# Altium footprint library My Library.PcbLib: 872 footprints (part 42 of 55)
Each footprint in its own frame and in the unit in brackets; x right, y up, seen from the top. Pads: shape width x height; smd on the part's side, far side on the other; paste and mask are expansions set on the pad; w line width, h text height; cw(c..) or ccw(c..) is an arc to the next point about the centre after c.
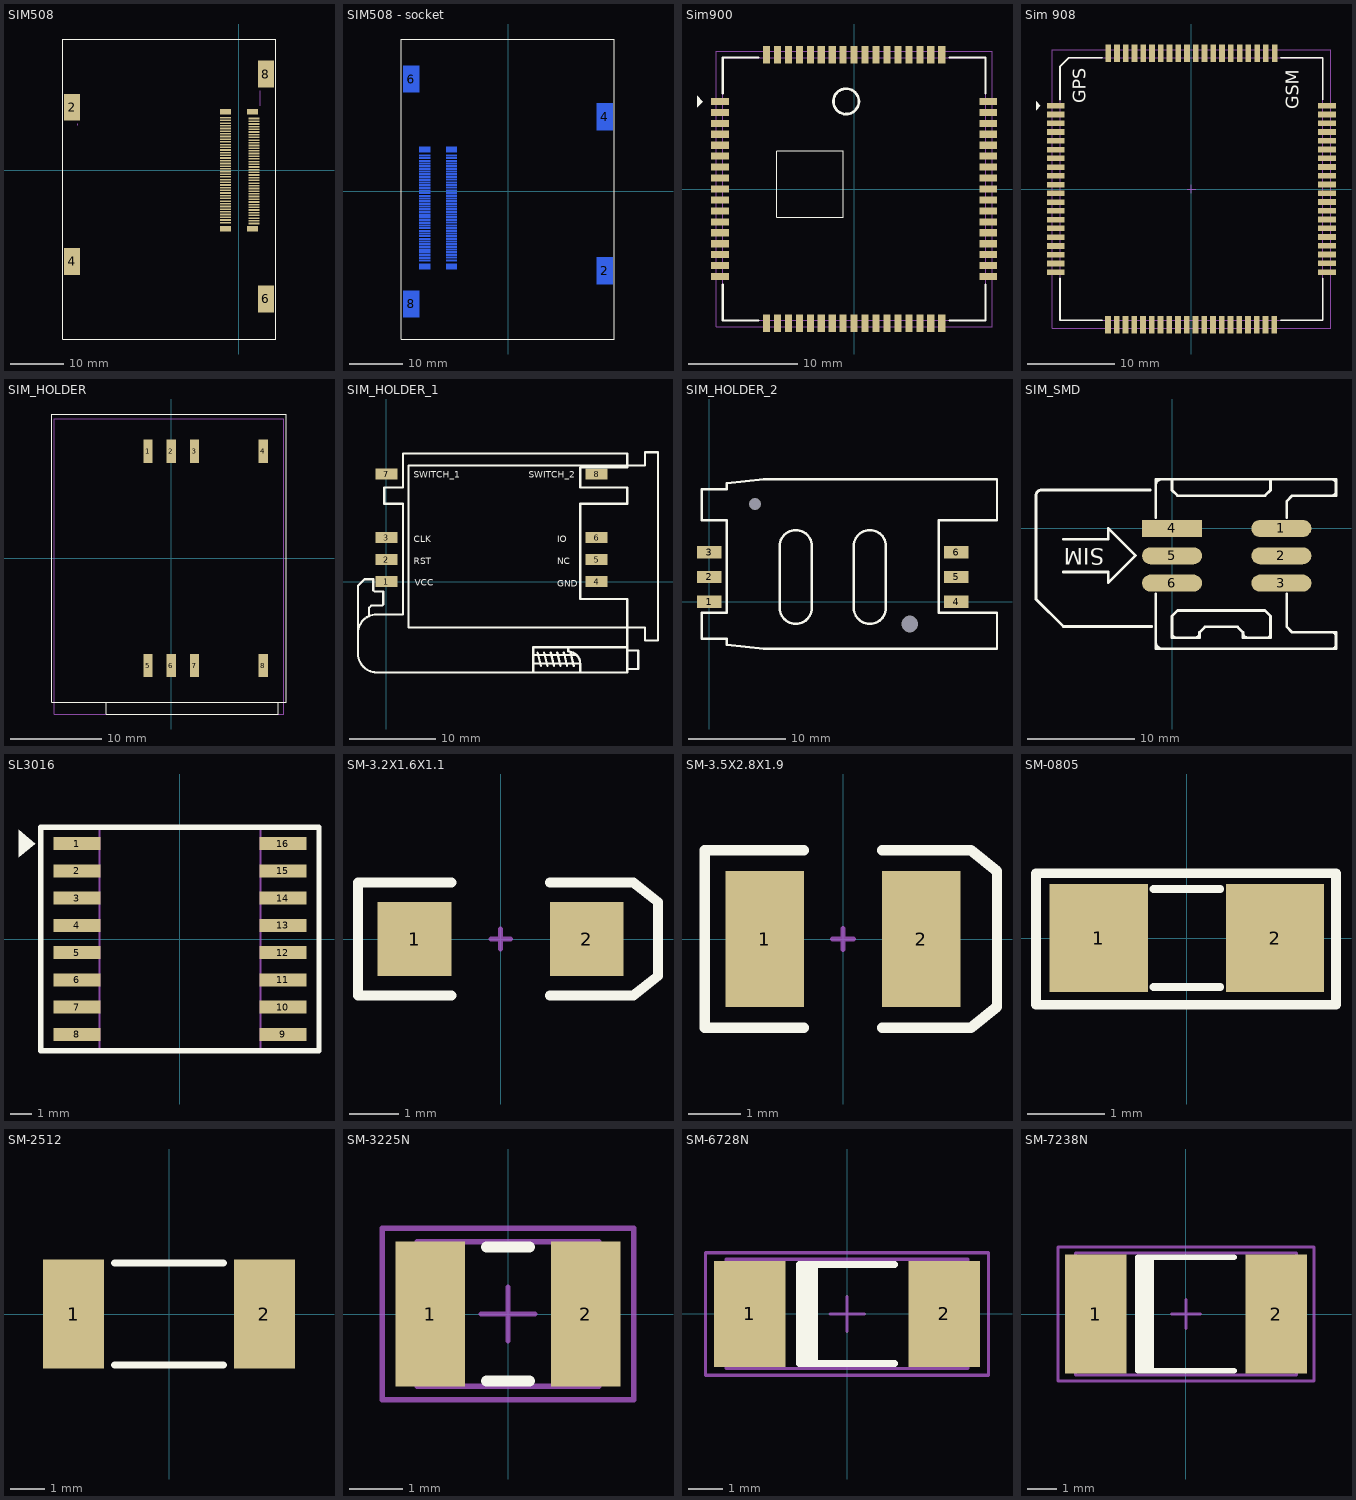
[diagram p41: the footprints below, top view; thin cyan lines are the x and y axes]

## SIM508 [mm]
pads (88):
  rect 2x0.305 smd: 1(-2.499,-9.75) 2(2.794,-9.906) 3(-2.499,-9.25) 4(2.794,-9.406) 5(-2.499,-8.75) 6(2.794,-8.906) 7(-2.499,-8.25) 8(2.794,-8.406) 9(-2.499,-7.75) 10(2.794,-7.906) 11(-2.499,-7.25) 12(2.794,-7.406) 13(-2.499,-6.75) 14(2.794,-6.906) 15(-2.499,-6.25) 16(2.794,-6.406) 17(-2.499,-5.75) 18(2.794,-5.906) 19(-2.499,-5.25) 20(2.794,-5.406) 21(-2.499,-4.75) 22(2.794,-4.906) 23(-2.499,-4.25) 24(2.794,-4.406) 25(-2.499,-3.75) 26(2.794,-3.906) 27(-2.499,-3.25) 28(2.794,-3.406) 29(-2.499,-2.75) 30(2.794,-2.906) 31(-2.499,-2.25) 32(2.794,-2.406) 33(-2.499,-1.75) 34(2.794,-1.906) 35(-2.499,-1.25) 36(2.794,-1.406) 37(-2.499,-0.75) 38(2.794,-0.906) 39(-2.499,-0.25) 40(2.794,-0.406) 41(-2.499,0.25) 42(2.794,0.094) 43(-2.499,0.75) 44(2.794,0.594) 45(-2.499,1.25) 46(2.794,1.094) 47(-2.499,1.75) 48(2.794,1.594) 49(-2.499,2.25) 50(2.794,2.094) 51(-2.499,2.75) 52(2.794,2.594) 53(-2.499,3.25) 54(2.794,3.094) 55(-2.499,3.75) 56(2.794,3.594) 57(-2.499,4.25) 58(2.794,4.094) 59(-2.499,4.75) 60(2.794,4.594) 61(-2.499,5.25) 62(2.794,5.094) 63(-2.499,5.75) 64(2.794,5.594) 65(-2.499,6.25) 66(2.794,6.094) 67(-2.499,6.75) 68(2.794,6.594) 69(-2.499,7.25) 70(2.794,7.094) 71(-2.499,7.75) 72(2.794,7.594) 73(-2.499,8.25) 74(2.794,8.094) 75(-2.499,8.75) 76(2.794,8.594) 77(-2.499,9.25) 78(2.794,9.094) 79(-2.499,9.75) 80(2.794,9.594)
  rect 3x5 smd: 2(-31,11.691) 4(-31,-16.945) 6(5,-23.945) 8(5,17.871)
  rect 2x1 smd: ""(-2.499,-10.875) ""(-2.499,10.875) ""(2.499,-10.875) ""(2.499,10.875)
Top Overlay:
  lines w0.102: -32.766,-31.383 6.858,-31.383 6.858,24.383 -32.766,24.383 -32.766,-31.383
Mechanical 1:
  lines w0.102: -30,8.357 -30,8.636 ; 4,11.938 4,14.732
3D body: height 0.2, standoff 0, extent -2.441,-5.855 -1.501,-5.642
3D body: height 2, standoff 0, extent -1.626,-11.481 1.6,11.405
3D body: height 0.2, standoff 0, extent 1.499,10.516 2.438,11.227
3D body: height 0.2, standoff 0, extent 1.499,-11.234 2.438,-10.523
3D body: height 0.2, standoff 0, extent -2.441,-11.227 -1.501,-10.516
3D body: height 0.2, standoff 0, extent -2.441,10.523 -1.501,11.234
3D body: height 0.2, standoff 0, extent 1.498,9.642 2.438,9.855
3D body: height 0.2, standoff 0, extent 1.498,9.142 2.438,9.355
3D body: height 0.2, standoff 0, extent 1.498,8.142 2.438,8.355
3D body: height 0.2, standoff 0, extent 1.498,8.642 2.438,8.855
3D body: height 0.2, standoff 0, extent 1.498,6.642 2.438,6.855
3D body: height 0.2, standoff 0, extent 1.498,6.142 2.438,6.355
3D body: height 0.2, standoff 0, extent 1.498,7.142 2.438,7.355
3D body: height 0.2, standoff 0, extent 1.498,7.642 2.438,7.855
3D body: height 0.2, standoff 0, extent 1.498,3.642 2.438,3.855
3D body: height 0.2, standoff 0, extent 1.498,3.142 2.438,3.355
3D body: height 0.2, standoff 0, extent 1.498,2.142 2.438,2.355
3D body: height 0.2, standoff 0, extent 1.498,2.642 2.438,2.855
3D body: height 0.2, standoff 0, extent 1.498,4.642 2.438,4.855
3D body: height 0.2, standoff 0, extent 1.498,4.142 2.438,4.355
3D body: height 0.2, standoff 0, extent 1.498,5.142 2.438,5.355
3D body: height 0.2, standoff 0, extent 1.498,5.642 2.438,5.855
3D body: height 0.2, standoff 0, extent 1.498,-2.358 2.438,-2.145
3D body: height 0.2, standoff 0, extent 1.498,-2.858 2.438,-2.645
3D body: height 0.2, standoff 0, extent 1.498,-3.858 2.438,-3.645
3D body: height 0.2, standoff 0, extent 1.498,-3.358 2.438,-3.145
3D body: height 0.2, standoff 0, extent 1.498,-5.358 2.438,-5.145
3D body: height 0.2, standoff 0, extent 1.498,-5.858 2.438,-5.645
3D body: height 0.2, standoff 0, extent 1.498,-4.858 2.438,-4.645
3D body: height 0.2, standoff 0, extent 1.498,-4.358 2.438,-4.145
3D body: height 0.2, standoff 0, extent 1.498,-0.358 2.438,-0.145
3D body: height 0.2, standoff 0, extent 1.498,-0.858 2.438,-0.645
3D body: height 0.2, standoff 0, extent 1.498,-1.858 2.438,-1.645
3D body: height 0.2, standoff 0, extent 1.498,-1.358 2.438,-1.145
3D body: height 0.2, standoff 0, extent 1.498,0.642 2.438,0.855
3D body: height 0.2, standoff 0, extent 1.498,0.142 2.438,0.355
3D body: height 0.2, standoff 0, extent 1.498,1.142 2.438,1.355
3D body: height 0.2, standoff 0, extent 1.498,1.642 2.438,1.855
3D body: height 0.2, standoff 0, extent 1.498,-8.358 2.438,-8.145
3D body: height 0.2, standoff 0, extent 1.498,-8.858 2.438,-8.645
3D body: height 0.2, standoff 0, extent 1.498,-9.858 2.438,-9.645
3D body: height 0.2, standoff 0, extent 1.498,-9.358 2.438,-9.145
3D body: height 0.2, standoff 0, extent 1.498,-7.358 2.438,-7.145
3D body: height 0.2, standoff 0, extent 1.498,-7.858 2.438,-7.645
3D body: height 0.2, standoff 0, extent 1.498,-6.858 2.438,-6.645
3D body: height 0.2, standoff 0, extent 1.498,-6.358 2.438,-6.145
3D body: height 0.2, standoff 0, extent -2.441,6.145 -1.501,6.358
3D body: height 0.2, standoff 0, extent -2.441,6.645 -1.501,6.858
3D body: height 0.2, standoff 0, extent -2.441,7.645 -1.501,7.858
3D body: height 0.2, standoff 0, extent -2.441,7.145 -1.501,7.358
3D body: height 0.2, standoff 0, extent -2.441,9.145 -1.501,9.358
3D body: height 0.2, standoff 0, extent -2.441,9.645 -1.501,9.858
3D body: height 0.2, standoff 0, extent -2.441,8.645 -1.501,8.858
3D body: height 0.2, standoff 0, extent -2.441,8.145 -1.501,8.358
3D body: height 0.2, standoff 0, extent -2.441,-1.855 -1.501,-1.642
3D body: height 0.2, standoff 0, extent -2.441,-1.355 -1.501,-1.142
3D body: height 0.2, standoff 0, extent -2.441,-0.355 -1.501,-0.142
3D body: height 0.2, standoff 0, extent -2.441,-0.855 -1.501,-0.642
3D body: height 0.2, standoff 0, extent -2.441,1.145 -1.501,1.358
3D body: height 0.2, standoff 0, extent -2.441,1.645 -1.501,1.858
3D body: height 0.2, standoff 0, extent -2.441,0.645 -1.501,0.858
3D body: height 0.2, standoff 0, extent -2.441,0.145 -1.501,0.358
3D body: height 0.2, standoff 0, extent -2.441,4.145 -1.501,4.358
3D body: height 0.2, standoff 0, extent -2.441,4.645 -1.501,4.858
3D body: height 0.2, standoff 0, extent -2.441,5.645 -1.501,5.858
3D body: height 0.2, standoff 0, extent -2.441,5.145 -1.501,5.358
3D body: height 0.2, standoff 0, extent -2.441,3.145 -1.501,3.358
3D body: height 0.2, standoff 0, extent -2.441,3.645 -1.501,3.858
3D body: height 0.2, standoff 0, extent -2.441,2.645 -1.501,2.858
3D body: height 0.2, standoff 0, extent -2.441,2.145 -1.501,2.358
3D body: height 0.2, standoff 0, extent -2.441,-5.355 -1.501,-5.142
3D body: height 0.2, standoff 0, extent -2.441,-4.355 -1.501,-4.142
3D body: height 0.2, standoff 0, extent -2.441,-4.855 -1.501,-4.642
3D body: height 0.2, standoff 0, extent -2.441,-2.855 -1.501,-2.642
3D body: height 0.2, standoff 0, extent -2.441,-2.355 -1.501,-2.142
3D body: height 0.2, standoff 0, extent -2.441,-3.355 -1.501,-3.142
3D body: height 0.2, standoff 0, extent -2.441,-3.855 -1.501,-3.642
3D body: height 0.2, standoff 0, extent -2.441,-7.855 -1.501,-7.642
3D body: height 0.2, standoff 0, extent -2.441,-7.355 -1.501,-7.142
3D body: height 0.2, standoff 0, extent -2.441,-6.355 -1.501,-6.142
3D body: height 0.2, standoff 0, extent -2.441,-6.855 -1.501,-6.642
3D body: height 0.2, standoff 0, extent -2.441,-8.855 -1.501,-8.642
3D body: height 0.2, standoff 0, extent -2.441,-8.355 -1.501,-8.142
3D body: height 0.2, standoff 0, extent -2.441,-9.355 -1.501,-9.142
3D body: height 0.2, standoff 0, extent -2.441,-9.855 -1.501,-9.642
3D body: height 0.2, standoff 0, extent 3.73,16.384 5.75,19.384
3D body: height 0.2, standoff 0, extent 3.73,-25.432 5.75,-22.432
3D body: height 0.2, standoff 0, extent -31.75,-18.458 -29.73,-15.458
3D body: height 0.2, standoff 0, extent -31.75,10.178 -29.73,13.178
3D body: height 2, standoff 0, extent -29.718,-30.607 3.759,23.622
3D body: height 3, standoff 2, extent -30,-30.875 4,23.875

## SIM508 - socket [mil]
pads (88):
  rect 78.74x12 smd far side: 1(-610.18,264) 2(-413.44,264) 3(-610.18,244) 4(-413.44,244) 5(-610.18,224) 6(-413.44,224) 7(-610.18,205) 8(-413.44,205) 9(-610.18,185) 10(-413.44,185) 11(-610.18,165) 12(-413.44,165) 13(-610.18,146) 14(-413.44,146) 15(-610.18,126) 16(-413.44,126) 17(-610.18,106) 18(-413.44,106) 19(-610.18,86) 20(-413.44,87) 21(-610.18,67) 22(-413.44,67) 23(-610.18,47) 24(-413.44,47) 25(-610.18,27) 26(-413.44,28) 27(-610.18,8) 28(-413.44,8) 29(-610.18,-12) 30(-413.44,-12) 31(-610.18,-32) 32(-413.44,-31) 33(-610.18,-51) 34(-413.44,-51) 35(-610.18,-71) 36(-413.44,-71) 37(-610.18,-91) 38(-413.44,-91) 39(-610.18,-111) 40(-413.44,-110) 41(-610.18,-130) 42(-413.44,-130) 43(-610.18,-150) 44(-413.44,-150) 45(-610.18,-170) 46(-413.44,-169) 47(-610.18,-189) 48(-413.44,-189) 49(-610.18,-209) 50(-413.44,-209) 51(-610.18,-229) 52(-413.44,-228) 53(-610.18,-248) 54(-413.44,-248) 55(-610.18,-268) 56(-413.44,-268) 57(-610.18,-288) 58(-413.44,-287) 59(-610.18,-308) 60(-413.44,-307) 61(-610.18,-327) 62(-413.44,-327) 63(-610.18,-347) 64(-413.44,-346) 65(-610.18,-367) 66(-413.44,-366) 67(-610.18,-386) 68(-413.44,-386) 69(-610.18,-406) 70(-413.44,-406) 71(-610.18,-426) 72(-413.44,-425) 73(-610.18,-445) 74(-413.44,-445) 75(-610.18,-465) 76(-413.44,-465) 77(-610.18,-485) 78(-413.44,-484) 79(-610.18,-504) 80(-413.44,-504)
  rect 118.11x196.85 smd far side: 2(708.66,-579.84) 4(708.66,547.56) 6(-708.66,823.15) 8(-708.66,-823.15)
  rect 78.74x39.37 smd far side: ""(-610.18,-547.72) ""(-610.18,308.58) ""(-413.44,-547.72) ""(-413.44,308.58)
Top Overlay:
  lines w4: -781.81,-1079.53 -781.81,1115.98 778.19,1115.98 778.19,-1079.53 -781.81,-1079.53
3D body: height -19.68, standoff -59.06, extent -574.81,-568.57 -447.81,332.43
3D body: height 7.87, standoff 0, extent -738.19,-882.71 -658.67,-764.6
3D body: height 7.87, standoff 0, extent -738.19,763.58 -658.67,881.69
3D body: height 7.87, standoff 0, extent 658.67,489.01 738.19,607.12
3D body: height 7.87, standoff 0, extent 658.67,-638.38 738.19,-520.27

## Sim900 [mm] "Sim900,QFN, 68-Leads, Body 24,0x24,0mm (max), Pitch 1,00mm, IPC Medium Density"
height 3
pads (68):
  rect 1.6x0.65 smd: 1(-12.25,8) 2(-12.25,7) 3(-12.25,6) 4(-12.25,5) 5(-12.25,4) 6(-12.25,3) 7(-12.25,2) 8(-12.25,1) 9(-12.25,0) 10(-12.25,-1) 11(-12.25,-2) 12(-12.25,-3) 13(-12.25,-4) 14(-12.25,-5) 15(-12.25,-6) 16(-12.25,-7) 17(-12.25,-8) 35(12.25,-8) 36(12.25,-7) 37(12.25,-6) 38(12.25,-5) 39(12.25,-4) 40(12.25,-3) 41(12.25,-2) 42(12.25,-1) 43(12.25,0) 44(12.25,1) 45(12.25,2) 46(12.25,3) 47(12.25,4) 48(12.25,5) 49(12.25,6) 50(12.25,7) 51(12.25,8)
  rect 0.65x1.6 smd: 18(-8,-12.25) 19(-7,-12.25) 20(-6,-12.25) 21(-5,-12.25) 22(-4,-12.25) 23(-3,-12.25) 24(-2,-12.25) 25(-1,-12.25) 26(0,-12.25) 27(1,-12.25) 28(2,-12.25) 29(3,-12.25) 30(4,-12.25) 31(5,-12.25) 32(6,-12.25) 33(7,-12.25) 34(8,-12.25) 52(8,12.25) 53(7,12.25) 54(6,12.25) 55(5,12.25) 56(4,12.25) 57(3,12.25) 58(2,12.25) 59(1,12.25) 60(0,12.25) 61(-1,12.25) 62(-2,12.25) 63(-3,12.25) 64(-4,12.25) 65(-5,12.25) 66(-6,12.25) 67(-7,12.25) 68(-8,12.25)
Top Overlay:
  circle w0.254: c-0.727,8 r1.163
  region: -14.351,8.499 -13.843,7.991 -14.351,7.483
  lines w0.1: -7.087,-2.6 -7.087,3.429 ; -7.077,-2.6 -1,-2.6 -1,3.477 -7.077,3.477
  lines w0.2: -12,-8.725 -12,-12 -8.725,-12 ; -12,8.725 -12,12 -8.725,12 ; 8.725,-12 12,-12 12,-8.725 ; 8.725,12 12,12 12,8.725
Mechanical 13:
  lines w0.1: -12,-12 -12,12 12,12 12,-12 -12,-12
Mechanical 15:
  lines w0.1: -12.6,-12.6 -12.6,12.6 12.6,12.6 12.6,-12.6 -12.6,-12.6
3D body "User Library-GSM_SIM900.STEP": height 3, standoff 0, extent -12,-11.949 12,12.051

## Sim 908 [mil] "Sim 908 GPRS-GPS"
pads (80):
  rect 80x25.59 smd: 1(-610,374.02) 2(-610,334.65) 3(-610,295.28) 4(-610,255.91) 5(-610,216.54) 6(-610,177.17) 7(-610,137.8) 8(-610,98.43) 9(-610,59.06) 10(-610,19.69) 11(-610,-19.68) 12(-610,-59.06) 13(-610,-98.43) 14(-610,-137.8) 15(-610,-177.17) 16(-610,-216.54) 17(-610,-255.91) 18(-610,-295.28) 19(-610,-334.65) 20(-610,-374.02) 41(610,-373.66) 42(610,-334.29) 43(610,-294.92) 44(610,-255.55) 45(610,-216.18) 46(610,-176.81) 47(610,-137.44) 48(610,-98.07) 49(610,-58.7) 50(610,-19.33) 51(610,20.04) 52(610,59.41) 53(610,98.78) 54(610,138.15) 55(610,177.52) 56(610,216.89) 57(610,256.26) 58(610,295.63) 59(610,335) 60(610,374.37)
  rect 25.59x80 smd: 21(-375.59,-610) 22(-336.22,-610) 23(-296.85,-610) 24(-257.48,-610) 25(-218.11,-610) 26(-178.74,-610) 27(-139.37,-610) 28(-100,-610) 29(-60.63,-610) 30(-21.26,-610) 31(18.11,-610) 32(57.48,-610) 33(96.85,-610) 34(136.22,-610) 35(175.59,-610) 36(214.96,-610) 37(254.33,-610) 38(293.7,-610) 39(333.07,-610) 40(372.44,-610) 61(374.02,610) 62(334.65,610) 63(295.28,610) 64(255.91,610) 65(216.54,610) 66(177.17,610) 67(137.8,610) 68(98.43,610) 69(59.06,610) 70(19.68,610) 71(-19.69,610) 72(-59.06,610) 73(-98.43,610) 74(-137.8,610) 75(-177.17,610) 76(-216.54,610) 77(-255.91,610) 78(-295.28,610) 79(-334.65,610) 80(-374.02,610)
Top Overlay:
  region: -699,394 -679,374 -699,354
  lines w7.87: -590.55,-402.56 -590.55,-590.55 -402.56,-590.55 ; -590.55,402.56 -590.55,551.18 -551.18,590.55 -402.56,590.55 ; 402.56,-590.55 590.55,-590.55 590.55,-402.56 ; 402.56,590.55 590.55,590.55 590.55,402.56
  text "GPS" at -454,386 h98.43
  text "GSM" at 503,358 h98.43
Mechanical 13:
  lines w3.94: -590.55,-590.55 590.55,-590.55 590.55,590.55 -551.18,590.55 -590.55,551.18 -590.55,-590.55
Mechanical 15:
  lines w3.94: -19.69,0 19.68,0 ; 0,-19.68 0,19.69 ; -626.97,-626.97 626.97,-626.97 626.97,626.97 -626.97,626.97 -626.97,-626.97
3D body "User Library-SIM908.STEP": height 126.59, standoff 0.6, extent -590.3,-592.22 590.81,588.89

## SIM_HOLDER [mm]
pads (8):
  rect 1x2.54 smd: 1(-2.542,11.72) 2(-0.002,11.72) 3(2.538,11.72) 4(10.058,11.72) 5(-2.542,-11.72) 6(-0.002,-11.72) 7(2.538,-11.72) 8(10.058,-11.72)
Top Overlay:
  lines w0.1: -7.112,-15.748 -7.112,-17.018 11.684,-17.018 11.684,-15.748
  lines w0.102: -13.066,-15.748 12.558,-15.748 12.558,15.782 -13.066,15.782 -13.066,-15.748
Mechanical 1:
  lines w0.102: -12.812,-17.018 -8.114,-17.018 11.886,-17.018 12.304,-17.018 12.304,-15.45 12.304,0 12.304,10.45 12.304,15.274 -8.198,15.274 -12.812,15.274 -12.812,-4.65 -12.812,-15.45 -12.812,-17.018
3D body: height 1.7, standoff 1.2, extent -7.111,11.211 -2.83,15.274
3D body: height 3.5, standoff 0, extent -8.114,-17.018 11.886,-16.45
3D body: height 3, standoff 0, extent -7.312,-16.45 11.104,10.45
3D body: height 3, standoff 0, extent 11.104,-15.45 12.304,10.45
3D body: height 3, standoff 0, extent -12.812,-15.449 -5.812,15.274
3D body: height 2.4, standoff 0.6, extent -12.243,-16.509 -10.451,-15.409
3D body: height 3, standoff 0, extent 5.283,10.451 7.821,12.953
3D body: height 3, standoff 0, extent -12.811,-15.449 -9.813,-4.651

## SIM_HOLDER_1 [mil]
pads (8):
  rect 100x50 smd: 1(0,0) 2(0,100) 3(0,200) 4(960,0) 5(960,100) 6(960,200) 7(0,490) 8(960,490)
Top Overlay:
  lines w10: -130,-225 -130,-20 -100,10 -60,10 -60,-40 -55,-45 -15,-45 -15,-105 -20,-110 -70,-110 -80,-120 -80,-160 ; -45,-414.85 cw(c-45,-330) -129.85,-330 -130,-330 -130,-235 cw(c-45.15,-235) -45.15,-150.15 74.85,-150.15 75,-150 75,355 -10,355 -10,430 75,430 75,585 1100,585 1100,520 885,520 885,430 1100,430 1100,355 885,355 885,-80 1100,-80 1100,-415 ; -44.85,-415 1100,-415 ; 670,-414.85 670,-300 1100,-300 ; 670,-375 885,-375 ; 670,-335 865,-335 ; 690,-325 705,-385 ; 720,-325 735,-385 ; 750,-325 765,-385 ; 780,-325 795,-385 ; 810,-325 825,-385 ; 830,-300 830,-320 cw(c830,-375) 885,-375 ; 840,-325 855,-385 ; 885,-414.85 885,-375 ; 1100,-414.85 1100,-415 ; 1100,-400 1150,-400 1150,-315 1100,-315 ; 100,-210 100,530 1180,530 1180,590 1240,590 1240,-270 1200,-270 1180,-270 1180,-210 100,-210
  text "SWITCH_2" at 650,475 h30
  text "SWITCH_1" at 125,475 h30
  text "GND" at 780,-25 h30
  text "NC" at 780,80 h30
  text "IO" at 780,180 h30
  text "CLK" at 125,180 h30
  text "VCC" at 130,-20 h30
  text "RST" at 125,80 h30
Mechanical 3:
  text "SW" at 836,480 h20
  text "SW" at 90,480 h20
  text "CLK" at 90,190 h20
  text "I/0" at 820,190 h20
  text "VPP" at 817,90 h20
  text "GND" at 817,-10 h20
  text "VCC" at 90,-10 h20
  text "RST" at 90,90 h20

## SIM_HOLDER_2 [mil]
pads (8):
  rect 100x50 smd: 1(0,0) 2(0,100) 3(0,200) 4(1000,0) 5(1000,100) 6(1000,200)
  round 10 hole 68: 3(812,-90)
  round 10 hole 48: 4(185,395)
Top Overlay:
  lines w10: -30,-150 -30,-45 70,-45 70,330 -30,330 -30,455 70,455 70,480 220,495 1165,495 1165,330 930,330 930,-45 1165,-45 1165,-190 220,-190 70,-175 70,-150 -30,-150 ; 285,-25 ccw(c350,-25) 415,-25 415,225 ccw(c350,225) 285,225 285,-25 ; 585,-25 ccw(c650,-25) 715,-25 715,225 ccw(c650,225) 585,225 585,-25
Mechanical 3:
  text "CLK" at 85,190 h20
  text "RST" at 85,90 h20
  text "VCC" at 85,-10 h20
  text "GND" at 862,-10 h20
  text "VPP" at 862,90 h20
  text "I/0" at 865,190 h20

## SIM_SMD [mil]
pads (6):
  oval 220x62 smd: 1(400,0) 2(400,-100) 3(400,-200) 5(0,-100) 6(0,-200)
  rect 220x62 smd: 4(0,0)
Top Overlay:
  lines w10: -398,-159 -234,-159 -234,-199 -134,-99 -234,1 -234,-39 -397,-39 ; -80,141 -478,141 ccw(c-478,121) -498,121 -498,-259 -398,-359 -74,-359 ; -60,-413 -60,-417 ccw(c-37,-417) -37,-440 ; -60,-400 -60,-240 ; -60,-300 -60,-440 600,-440 600,-380 440,-380 420,-360 420,-300 420,-240 ; -60,40 -60,180 600,180 600,120 440,120 420,100 420,40 ; -60,140 -60,159 cw(c-39,159) -39,180 ; 0,-383 0,-386 ccw(c14,-386) 14,-400 ; 0,180 0,140 20,120 120,120 340,120 360,140 360,180 ; 86,-400 ccw(c86,-386) 100,-386 100,-380 ; 276,-400 cw(c276,-384) 260,-384 260,-380 ; 343,-400 349,-400 ccw(c349,-389) 360,-389 ; 581,-440 583,-440 ; 585,120 ccw(c585,135) 600,135 600,137 ; 585,180 cw(c585,165) 600,165 600,162 ; 587,-440 ccw(c587,-427) 600,-427 600,-425 ; 587,-380 cw(c587,-393) 600,-393 600,-394 ; 100,-380 100,-400 0,-400 0,-320 20,-300 340,-300 360,-320 360,-380 360,-400 260,-400 260,-380 ; 100,-380 120,-360 240,-360 260,-380
  text "SIM" at -248,-73 h60

## SL3016 [mm]
pads (16):
  rect 2.2x0.6 smd: 1(-4.795,4.445) 2(-4.795,3.175) 3(-4.795,1.905) 4(-4.795,0.635) 5(-4.795,-0.635) 6(-4.795,-1.905) 7(-4.795,-3.175) 8(-4.795,-4.445) 9(4.795,-4.445) 10(4.795,-3.175) 11(4.795,-1.905) 12(4.795,-0.635) 13(4.795,0.635) 14(4.795,1.905) 15(4.795,3.175) 16(4.795,4.445)
Top Overlay:
  region: -6.731,4.445 -7.493,5.08 -7.493,3.81
  lines w0.254: -6.477,-5.207 -6.477,5.207 6.477,5.207 6.477,-5.207 -6.477,-5.207
Mechanical 13:
  lines w0.1: -3.75,-5.15 -3.75,5.15 3.75,5.15 3.75,-5.15 -3.75,-5.15
3D body: height 1.35, standoff 1.25, extent -4.445,4.191 -3.175,4.699
3D body: height 1.35, standoff 0, extent -4.572,4.191 -4.445,4.699
3D body: height 0.1, standoff 0, extent -5.334,4.191 -4.572,4.699
3D body: height 0.1, standoff 0, extent -5.334,2.921 -4.572,3.429
3D body: height 1.35, standoff 0, extent -4.572,2.921 -4.445,3.429
3D body: height 1.35, standoff 1.25, extent -4.445,2.921 -3.175,3.429
3D body: height 0.1, standoff 0, extent -5.334,1.651 -4.572,2.159
3D body: height 1.35, standoff 0, extent -4.572,1.651 -4.445,2.159
3D body: height 1.35, standoff 1.25, extent -4.445,1.651 -3.175,2.159
3D body: height 0.1, standoff 0, extent -5.334,0.381 -4.572,0.889
3D body: height 1.35, standoff 0, extent -4.572,0.381 -4.445,0.889
3D body: height 1.35, standoff 1.25, extent -4.445,0.381 -3.175,0.889
3D body: height 0.1, standoff 0, extent -5.334,-0.889 -4.572,-0.381
3D body: height 1.35, standoff 0, extent -4.572,-0.889 -4.445,-0.381
3D body: height 1.35, standoff 1.25, extent -4.445,-0.889 -3.175,-0.381
3D body: height 0.1, standoff 0, extent -5.334,-2.159 -4.572,-1.651
3D body: height 1.35, standoff 0, extent -4.572,-2.159 -4.445,-1.651
3D body: height 1.35, standoff 1.25, extent -4.445,-2.159 -3.175,-1.651
3D body: height 0.1, standoff 0, extent -5.334,-3.429 -4.572,-2.921
3D body: height 1.35, standoff 0, extent -4.572,-3.429 -4.445,-2.921
3D body: height 1.35, standoff 1.25, extent -4.445,-3.429 -3.175,-2.921
3D body: height 0.1, standoff 0, extent -5.334,-4.699 -4.572,-4.191
3D body: height 1.35, standoff 0, extent -4.572,-4.699 -4.445,-4.191
3D body: height 1.35, standoff 1.25, extent -4.445,-4.699 -3.175,-4.191
3D body: height 1.35, standoff 1.25, extent 3.175,4.191 4.445,4.699
3D body: height 1.35, standoff 0, extent 4.445,4.191 4.572,4.699
3D body: height 0.1, standoff 0, extent 4.572,4.191 5.334,4.699
3D body: height 1.35, standoff 1.25, extent 3.175,2.921 4.445,3.429
3D body: height 1.35, standoff 0, extent 4.445,2.921 4.572,3.429
3D body: height 0.1, standoff 0, extent 4.572,2.921 5.334,3.429
3D body: height 1.35, standoff 1.25, extent 3.175,1.651 4.445,2.159
3D body: height 1.35, standoff 0, extent 4.445,1.651 4.572,2.159
3D body: height 0.1, standoff 0, extent 4.572,1.651 5.334,2.159
3D body: height 1.35, standoff 1.25, extent 3.175,0.381 4.445,0.889
3D body: height 1.35, standoff 0, extent 4.445,0.381 4.572,0.889
3D body: height 0.1, standoff 0, extent 4.572,0.381 5.334,0.889
3D body: height 1.35, standoff 1.25, extent 3.175,-0.889 4.445,-0.381
3D body: height 1.35, standoff 0, extent 4.445,-0.889 4.572,-0.381
3D body: height 0.1, standoff 0, extent 4.572,-0.889 5.334,-0.381
3D body: height 1.35, standoff 1.25, extent 3.175,-2.159 4.445,-1.651
3D body: height 1.35, standoff 0, extent 4.445,-2.159 4.572,-1.651
3D body: height 0.1, standoff 0, extent 4.572,-2.159 5.334,-1.651
3D body: height 1.35, standoff 1.25, extent 3.175,-3.429 4.445,-2.921
3D body: height 1.35, standoff 0, extent 4.445,-3.429 4.572,-2.921
3D body: height 0.1, standoff 0, extent 4.572,-3.429 5.334,-2.921
3D body: height 0.1, standoff 0, extent 4.572,-4.699 5.334,-4.191
3D body: height 1.35, standoff 0, extent 4.445,-4.699 4.572,-4.191
3D body: height 1.35, standoff 1.25, extent 3.175,-4.699 4.445,-4.191
3D body: height 2.65, standoff 0, extent -3.474,3.571 -2.456,4.589
3D body: height 2.65, standoff 0.1, extent -3.75,-5.15 3.75,5.15

## SM-3.2X1.6X1.1 [mm] "SMT LED; 2 Flat Leads"
height 1.2
pads (2):
  rect 1.5x1.5 smd: 1(-1.75,0) 2(1.75,0)
Top Overlay:
  lines w0.2: -1,-1.15 -2.9,-1.15 -2.9,1.15 -1,1.15 ; 1,-1.15 2.7,-1.15 3.2,-0.75 3.2,0.75 2.7,1.15 1,1.15
Mechanical 1:
  lines w0.1: -0.2,0 0.2,0 ; 0,-0.2 0,0.2
3D body "SW3DPS-RESISTOR 1206-DEFAULT.STEP": height 0.53, standoff -0.03, extent -1.473,-0.889 1.727,0.771

## SM-3.5X2.8X1.9 [mm] "SM LED; 2 C-Bend Leads; Body 3.5 x 2.8 x 1.9 mm, inc leads (LxWxH typ)"
height 1.9
pads (2):
  rect 1.5x2.6 smd: 1(-1.5,0) 2(1.5,0)
Top Overlay:
  lines w0.2: -0.75,-1.7 -2.65,-1.7 -2.65,1.7 -0.75,1.7 ; 0.75,-1.7 2.45,-1.7 2.95,-1.3 2.95,1.3 2.45,1.7 0.75,1.7
Mechanical 1:
  lines w0.1: -0.2,0 0.2,0 ; 0,-0.2 0,0.2

## SM-0805 [mil] "Compoment SMD 80x50mil"
height 50
pads (2):
  rect 50x55 smd: 1(-45,0) 2(45,0)
Top Overlay:
  lines w4: -17,-25 17,-25 ; -17,25 17,25
  lines w5: -77,-34 76,-34 76,33 -77,33 -77,-34
3D body "SW3dPS-smt_resistor_packages.STEP": height 24.02, standoff -0.39, extent -39.76,-27 39.77,23

## SM-2512 [mm] "Chip Resistor; Body 6.3 x 3.2 mm (LxW typ) - C"
height 0.6
pads (2):
  rect 1.8x3.2 smd: 1(-2.8,0) 2(2.8,0)
Top Overlay:
  lines w0.2: -1.6,-1.5 1.6,-1.5 ; -1.6,1.5 1.6,1.5

## SM-3225N [mm] "Chip Capacitor, Body 3.2x2.5mm, IPC Medium Density"
height 1.35
pads (2):
  rect 1.3x2.7 smd: 1(-1.45,0) 2(1.45,0)
Top Overlay:
  lines w0.2: -0.4,-1.25 0.4,-1.25 ; -0.4,1.25 0.4,1.25
Mechanical 13:
  lines w0.1: -1.7,-1.35 -1.7,1.35 1.7,1.35 1.7,-1.35 -1.7,-1.35
Mechanical 15:
  lines w0.1: -0.5,0 0.5,0 ; 0,-0.5 0,0.5 ; -2.35,-1.6 -2.35,1.6 2.35,1.6 2.35,-1.6 -2.35,-1.6
3D body: height 1.35, standoff 0, extent -1.7,-1.35 1.7,1.35

## SM-6728N [mm] "Chip Capacitor, Body 6.7x2.8mm, IPC Medium Density"
height 3.18
pads (2):
  rect 2.1x3.1 smd: 1(-2.85,0) 2(2.85,0)
Top Overlay:
  rectangle: -1.4,-1.45 -0.85,1.45
  lines w0.2: 1.4,-1.45 -1.4,-1.45 -1.4,1.45 1.4,1.45
Mechanical 13:
  lines w0.1: -3.55,-1.6 -3.55,1.6 3.55,1.6 3.55,-1.6 -3.55,-1.6
Mechanical 15:
  lines w0.1: -0.5,0 0.5,0 ; 0,-0.5 0,0.5 ; -4.15,-1.8 -4.15,1.8 4.15,1.8 4.15,-1.8 -4.15,-1.8
3D body: height 3.18, standoff 0, extent -3.55,-1.6 3.55,1.6

## SM-7238N [mm] "Chip Capacitor, Body 7.2x3.8mm, IPC Medium Density"
height 3.18
pads (2):
  rect 2.1x4.1 smd: 1(-3.1,0) 2(3.1,0)
Top Overlay:
  rectangle: -1.65,-1.95 -1.1,1.95
  lines w0.2: 1.65,-1.95 -1.65,-1.95 -1.65,1.95 1.65,1.95
Mechanical 13:
  lines w0.1: -3.8,-2.1 3.8,-2.1 3.8,2.1 -3.8,2.1 -3.8,-2.1
Mechanical 15:
  lines w0.1: -0.5,0 0.5,0 ; 0,-0.5 0,0.5 ; -4.4,-2.3 4.4,-2.3 4.4,2.3 -4.4,2.3 -4.4,-2.3
3D body: height 3.18, standoff 0, extent -3.8,-2.1 3.8,2.1